# Altium footprint library My Footprint.PcbLib: 268 footprints (part 4 of 17)
Each footprint in its own frame and in the unit in brackets; x right, y up, seen from the top. Pads: shape width x height; smd on the part's side, far side on the other; paste and mask are expansions set on the pad; w line width, h text height; cw(c..) or ccw(c..) is an arc to the next point about the centre after c.
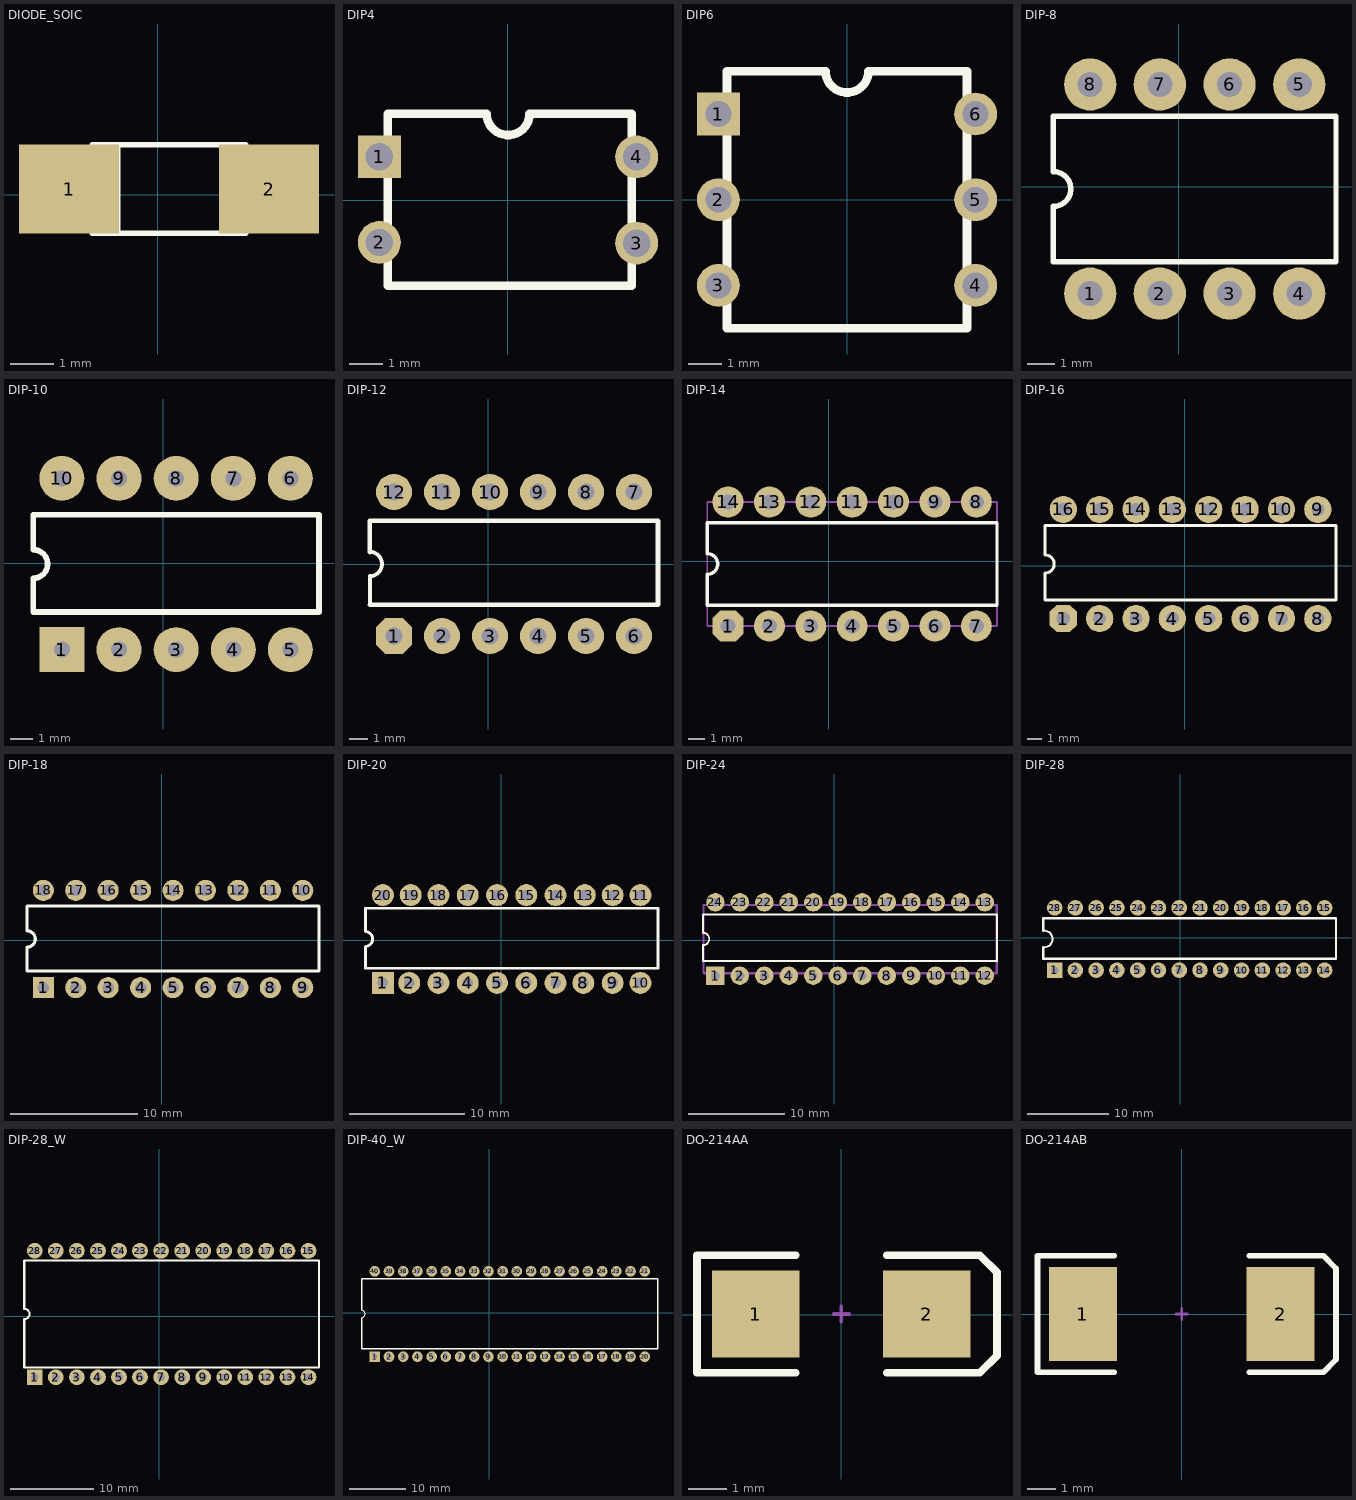
[diagram p3: the footprints below, top view; thin cyan lines are the x and y axes]

## DIODE_SOIC [mil] "Magnetic-Core Inductor with Winding Polarity Marking; 2 Leads"
pads (2):
  rect 90x80 smd: 1(-80,5) 2(100,5)
Top Overlay:
  lines w5: -58.9,-20 -58.9,-35 78.89,-35 78.89,-20 ; -58.9,30 -58.9,45 78.89,45 78.89,30 ; -36.1,-35 -36.1,45
3D body "SOD-80.STEP": height 59.06, standoff 0, extent -58.9,-24.53 78.9,34.52

## DIP4 [mil]
pads (4):
  rect 50x50 hole 32: 1(-149.68,50.68)
  round 50 hole 32: 2(-149.68,-49.32) 3(150.5,-50) 4(150.5,50.5)
Top Overlay:
  lines w10: -24.68,100.68 -140,100.68 -140,-99.82 145,-99.82 145,100.68 25.32,100.68 ; -24.5,101 ccw(c0.5,101) 25.5,101
3D body "DIP4.STEP": height 169.69, standoff -129.13, extent -157.48,-110 157.48,108.11
3D body: height 0, standoff 0, extent -140.02,-99.84 145.02,101.02

## DIP6 [mil]
pads (6):
  rect 50x50 hole 30: 1(-150,100)
  round 50 hole 30: 2(-150,0) 3(-150,-100) 4(150,-100) 5(150,0) 6(150,100)
Top Overlay:
  lines w10: -140,-150 -140,150 -25,150 ccw(c0,150) 25,150 140,150 140,-150 -140,-150
3D body "DIP6.STEP": height 169.69, standoff -129.13, extent -157.48,-163.11 157.48,155

## DIP-8 [mil]
pads (8):
  round 75 hole 36: 1(-127.28,-153.54) 2(-27.28,-153.54) 3(72.72,-153.54) 4(172.72,-153.54) 5(172.72,146.46) 6(72.72,146.46) 7(-27.28,146.46) 8(-127.28,146.46)
Top Overlay:
  lines w7.87: -180.04,-107.87 -180.04,-28.54 ccw(c-180.04,-3.54) -180.04,21.46 -180.04,100.79 225.47,100.79 225.47,-107.87 -180.04,-107.87
3D body "DIP8.STEP": height 177.17, standoff -137.8, extent -192.59,-157.76 232.6,147.77

## DIP-10 [mm]
pads (10):
  rect 2x2 hole 0.711: 1(-4.518,-3.839)
  round 2 hole 0.711: 2(-1.978,-3.839) 3(0.562,-3.839) 4(3.102,-3.839) 5(5.642,-3.839) 6(5.642,3.781) 7(3.102,3.781) 8(0.562,3.781) 9(-1.978,3.781) 10(-4.518,3.781)
Top Overlay:
  lines w0.254: -5.788,-2.159 -5.788,-0.664 ccw(c-5.788,-0.029) -5.788,0.606 -5.788,2.159 6.912,2.159 6.912,-2.159 -5.788,-2.159
3D body: height 4.5, standoff 0.7, extent -5.789,-3.64 6.913,3.562

## DIP-12 [mil]
pads (12):
  oct 75x75 hole 36: 1(-196,-150)
  round 75 hole 36: 2(-96,-150) 3(4,-150) 4(104,-150) 5(204,-150) 6(304,-150) 7(304,150) 8(204,150) 9(104,150) 10(4,150) 11(-96,150) 12(-196,150)
Top Overlay:
  lines w8: -246,-85 -246,-25 ccw(c-246,0) -246,25
  lines w10: -246.31,25.13 -246.31,90 354,90 354,-85 -246,-85
3D body: height 0, standoff 0, extent -246.34,-140.02 354.02,140.02
3D body: height 177.17, standoff 27.56, extent -251.31,-145 359,145

## DIP-14 [mil]
pads (14):
  oct 75x75 hole 36: 1(-243.07,-156.69)
  round 75 hole 36: 2(-143.07,-156.69) 3(-43.07,-156.69) 4(56.93,-156.69) 5(156.93,-156.69) 6(256.93,-156.69) 7(356.93,-156.69) 8(356.93,143.31) 9(256.93,143.31) 10(156.93,143.31) 11(56.93,143.31) 12(-43.07,143.31) 13(-143.07,143.31) 14(-243.07,143.31)
Top Overlay:
  lines w8: -293.07,-106.69 -293.07,-31.69 ccw(c-293.07,-6.69) -293.07,18.31 -293.07,93.31 406.93,93.31 406.93,-106.69 -293.07,-106.69
Mechanical 1:
  lines w4: -293.07,-156.69 -293.07,-81.69 -293.07,68.31 -293.07,143.31 406.93,143.31 406.93,-156.69 -293.07,-156.69
3D body "DIP14.STEP": height 179.92, standoff -150, extent -327.49,-158.94 437.47,148.93

## DIP-16 [mil]
pads (16):
  oct 75x75 hole 36: 1(-333.74,-145.87)
  round 75 hole 36: 2(-233.74,-145.87) 3(-133.74,-145.87) 4(-33.74,-145.87) 5(66.26,-145.87) 6(166.26,-145.87) 7(266.26,-145.87) 8(366.26,-145.87) 9(366.26,154.13) 10(266.26,154.13) 11(166.26,154.13) 12(66.26,154.13) 13(-33.74,154.13) 14(-133.74,154.13) 15(-233.74,154.13) 16(-333.74,154.13)
Top Overlay:
  lines w8: -383.74,-95 416.26,-95 416.26,110 -383.74,110 -383.74,29.13 cw(c-383.74,4.13) -383.74,-20.87 -383.74,-95
3D body "DIP16.STEP": height 179.92, standoff -150, extent -367.48,-153.94 397.48,153.93

## DIP-18 [mil]
pads (18):
  rect 65x65 hole 36: 1(-365.82,-146.42)
  round 65 hole 36: 2(-265.82,-146.42) 3(-165.82,-146.42) 4(-65.82,-146.42) 5(34.18,-146.42) 6(134.18,-146.42) 7(234.18,-146.42) 8(334.18,-146.42) 9(434.18,-146.42) 10(434.18,153.58) 11(334.18,153.58) 12(234.18,153.58) 13(134.18,153.58) 14(34.18,153.58) 15(-65.82,153.58) 16(-165.82,153.58) 17(-265.82,153.58) 18(-365.82,153.58)
Top Overlay:
  lines w10: -415.82,-95 -415.82,-21.42 ccw(c-415.82,3.58) -415.82,28.58 -415.82,105 484.18,105 484.18,-95 -415.82,-95
3D body "DIP18.STEP": height 179.92, standoff -150, extent -422.48,-148.93 492.48,158.94

## DIP-20 [mil]
pads (20):
  rect 75x75 hole 36: 1(-405,-145)
  round 75 hole 36: 2(-315,-145) 3(-215,-145) 4(-115,-145) 5(-15,-145) 6(85,-145) 7(185,-145) 8(280,-145) 9(380,-145) 10(475,-145) 11(475,155) 12(380,155) 13(285,155) 14(185,155) 15(85,155) 16(-15,155) 17(-115,155) 18(-215,155) 19(-310,155) 20(-405,155)
Top Overlay:
  lines w10: -465,-95 535,-95 535,110 -465,110 -465,30 cw(c-465,5) -465,-20 -465,-95
3D body "DIP20-300-metric.step": height 177.17, standoff -137.8, extent -468.93,-147.76 538.94,157.77

## DIP-24 [mil]
pads (24):
  rect 75x75 hole 36: 1(-485,-145)
  round 75 hole 36: 2(-385,-145) 3(-285,-145) 4(-185,-145) 5(-85,-145) 6(15,-145) 7(115,-145) 8(215,-145) 9(315,-145) 10(415,-145) 11(515,-145) 12(615,-145) 13(615,155) 14(515,155) 15(415,155) 16(315,155) 17(215,155) 18(115,155) 19(15,155) 20(-85,155) 21(-185,155) 22(-285,155) 23(-385,155) 24(-485,155)
Top Overlay:
  lines w7.87: -535,-85 665,-85 665,105 -535,105 -535,30 cw(c-535,5) -535,-20 -535,-85
Mechanical 13:
  lines w10: -533.43,-126.16 ccw(c-519.98,-126.16) -529.49,-135.67 663.43,-135.67 663.43,143.86 -533.43,143.86 -533.43,29.68 -533.43,-126.16
3D body "DIP24.STEP": height 179.92, standoff -150, extent -567.48,-148.93 697.48,158.94

## DIP-28 [mil]
pads (28):
  rect 75x75 hole 36: 1(-605,-155)
  round 75 hole 36: 2(-505,-155) 3(-405,-155) 4(-305,-155) 5(-205,-155) 6(-105,-155) 7(-5,-155) 8(95,-155) 9(195,-155) 10(295,-155) 11(395,-155) 12(495,-155) 13(595,-155) 14(695,-155) 15(695,145) 16(595,145) 17(495,145) 18(395,145) 19(295,145) 20(195,145) 21(95,145) 22(-5,145) 23(-105,145) 24(-205,145) 25(-305,145) 26(-405,145) 27(-505,145) 28(-605,145)
Top Overlay:
  lines w10: -660,34.73 -660,95 750,95 750,-100 -659.96,-100 -659.96,-44.69 ccw(c-655,-5) -659.96,34.69
3D body "DIP28.STEP": height 179.92, standoff -150, extent -644.96,-158.94 734.96,148.93

## DIP-28_W [mil]
pads (28):
  rect 75x75 hole 36: 1(-590,-290)
  round 75 hole 36: 2(-490,-290) 3(-390,-290) 4(-290,-290) 5(-190,-290) 6(-90,-290) 7(10,-290) 8(110,-290) 9(210,-290) 10(310,-290) 11(410,-290) 12(510,-290) 13(610,-290) 14(710,-290) 15(710,310) 16(610,310) 17(510,310) 18(410,310) 19(310,310) 20(210,310) 21(110,310) 22(10,310) 23(-90,310) 24(-190,310) 25(-290,310) 26(-390,310) 27(-490,310) 28(-590,310)
Top Overlay:
  lines w10: -640,-245 760,-245 760,265 -640,265 -640,35 cw(c-640,10) -640,-15 -640,-245
3D body "DIP28-W.STEP": height 200.39, standoff -150, extent -675.04,-293.93 795.04,313.94

## DIP-40_W [mil]
height 177.17
pads (40):
  rect 75x75 hole 36: 1(-807.02,-309.59)
  round 75 hole 36: 2(-707.02,-309.59) 3(-607.02,-309.59) 4(-507.02,-309.59) 5(-407.02,-309.59) 6(-307.02,-309.59) 7(-207.02,-309.59) 8(-107.02,-309.59) 9(-7.02,-309.59) 10(92.98,-309.59) 11(192.98,-309.59) 12(292.98,-309.59) 13(392.98,-309.59) 14(492.98,-309.59) 15(592.98,-309.59) 16(692.98,-309.59) 17(792.98,-309.59) 18(892.98,-309.59) 19(992.98,-309.59) 20(1092.98,-309.59) 21(1092.98,290.41) 22(992.98,290.41) 23(892.98,290.41) 24(792.98,290.41) 25(692.98,290.41) 26(592.98,290.41) 27(492.98,290.41) 28(392.98,290.41) 29(292.98,290.41) 30(192.98,290.41) 31(92.98,290.41) 32(-7.02,290.41) 33(-107.02,290.41) 34(-207.02,290.41) 35(-307.02,290.41) 36(-407.02,290.41) 37(-507.02,290.41) 38(-607.02,290.41) 39(-707.02,290.41) 40(-807.02,290.41)
Top Overlay:
  lines w7.87: -900.33,-34.59 ccw(c-900.33,-9.59) -900.33,15.41
  lines w10: -900.33,-34.59 -900.33,-255 1186.28,-255 1186.28,240 -900.33,240 -900.33,15.41
3D body "DIP40-600.step": height 224.41, standoff -101.57, extent -892.48,-314.92 1172.48,294.93

## DO-214AA [mm] "SMB"
pads (2):
  rect 2.3x2.3 smd: 1(-2.25,0.025) 2(2.25,0.025)
Top Overlay:
  lines w0.2: -1.2,-1.525 -3.8,-1.525 -3.8,1.575 -1.2,1.575 ; 1.2,-1.525 3.65,-1.525 4.1,-1.075 4.1,1.125 3.65,1.575 1.2,1.575
Mechanical 1:
  lines w0.1: -0.2,0.025 0.2,0.025 ; 0,-0.175 0,0.225

## DO-214AB [mm] "SMC"
pads (2):
  rect 2.4x3.3 smd: 1(-3.475,0) 2(3.475,0)
Top Overlay:
  lines w0.2: -2.375,-2.05 -5.075,-2.05 -5.075,2.05 -2.375,2.05 ; 2.375,-2.05 4.975,-2.05 5.425,-1.6 5.425,1.6 4.975,2.055 ; 2.375,2.05 4.975,2.05
Mechanical 1:
  lines w0.1: -0.2,0 0.2,0 ; 0,-0.2 0,0.2